# Altium footprint library EnerfiLib.PcbLib: 26 footprints (part 1 of 2)
Each footprint in its own frame and in the unit in brackets; x right, y up, seen from the top. Pads: shape width x height; smd on the part's side, far side on the other; paste and mask are expansions set on the pad; w line width, h text height; cw(c..) or ccw(c..) is an arc to the next point about the centre after c.
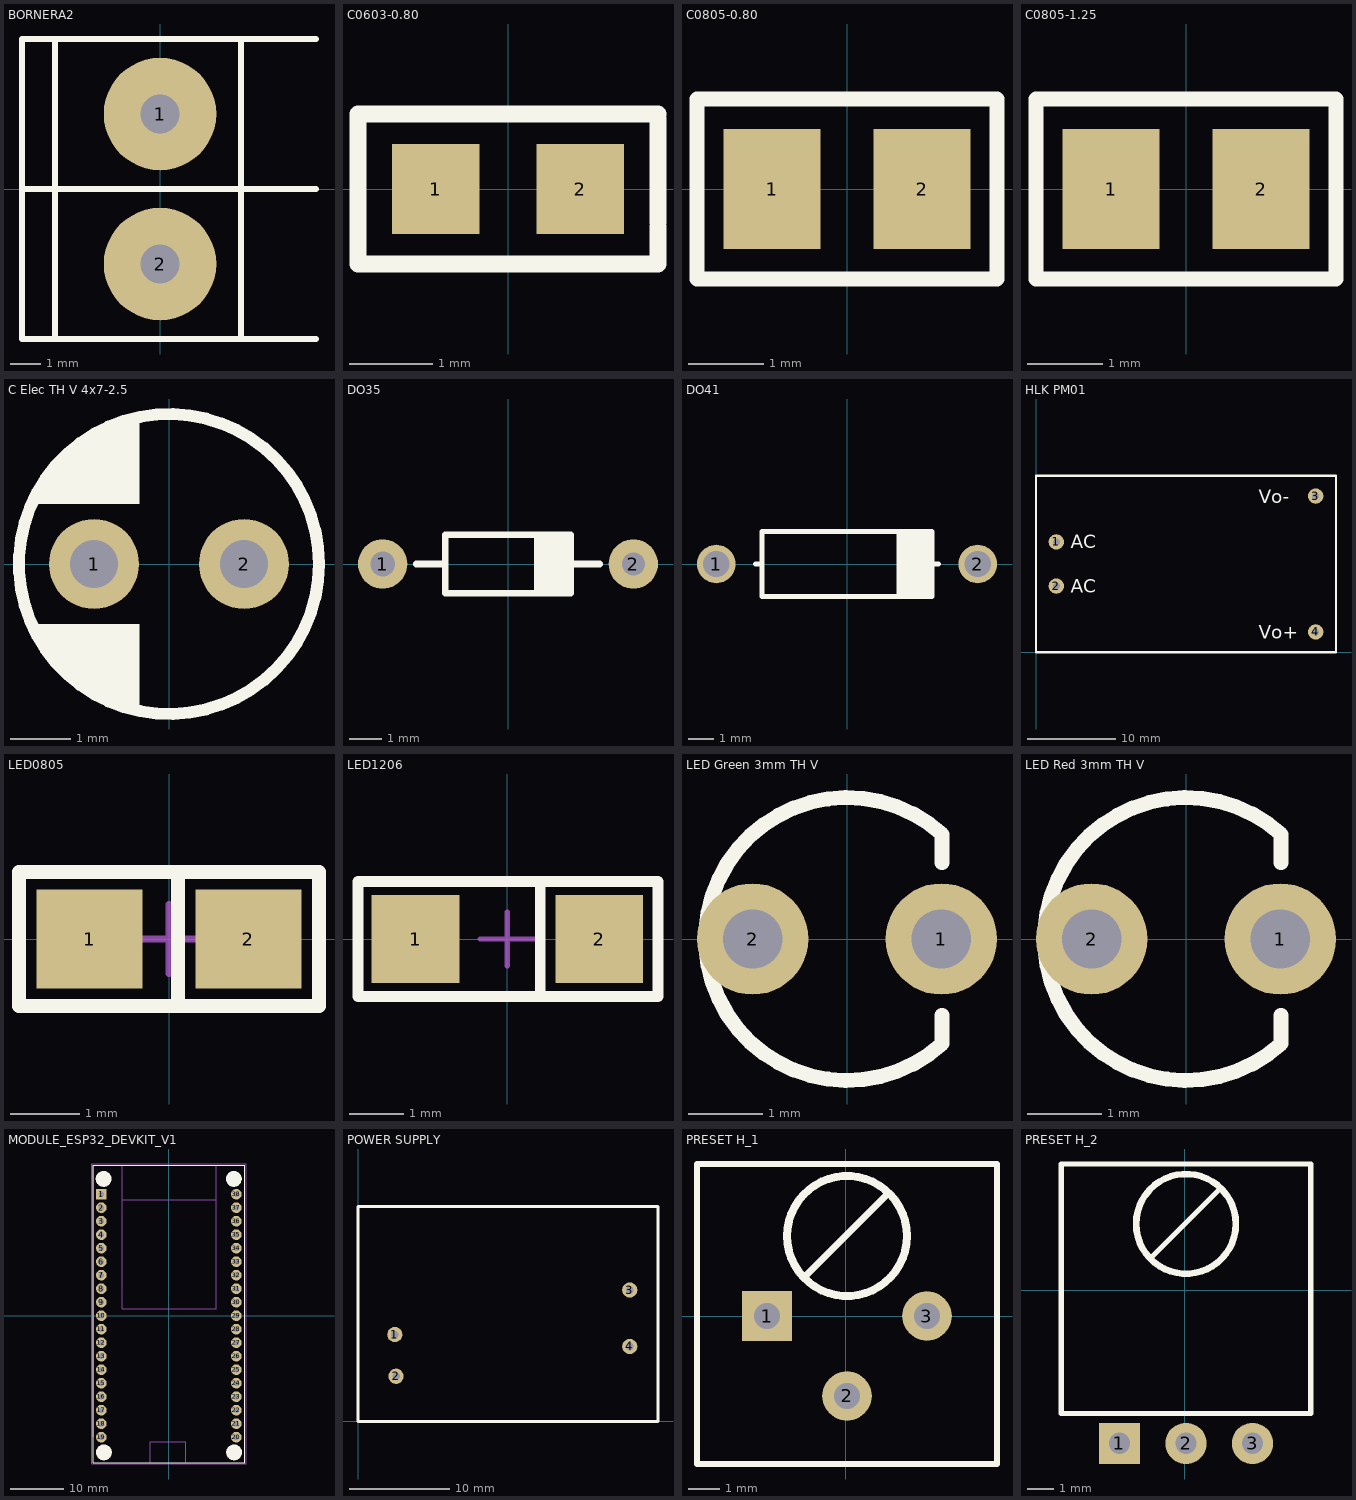
[diagram p0: the footprints below, top view; thin cyan lines are the x and y axes]

## BORNERA2 [mm] "Bornera con Tornillos 5mm separación"
pads (2):
  round 3.75 hole 1.3: 1(0,2.5) 2(0,-2.5)
Top Overlay:
  lines w0.2: -4.6,0 5.2,0 ; -3.5,-5 -3.5,5 ; 2.7,-5 2.7,5 ; 5.2,-5 -4.6,-5 -4.6,5 5.2,5
3D body "BORNERA_2.step": height 10, standoff -2.28, extent -3.763,-4.892 3.937,5.607

## C0603-0.80 [mm] "Capacitor Chip 0603 Height 0.80mm"
height 0.8
pads (2):
  rect 1.05x1.08 smd: 1(-0.865,0) 2(0.865,0)
Top Overlay:
  lines w0.2: 1.8,-0.45 1.8,-0.9 -1.8,-0.9 -1.8,0.9 1.8,0.9 ; 1.8,-0.4 1.8,0.5 ; 1.8,0.4 1.8,0.85
3D body "C0603-0.80.step": height 0.81, standoff 0, extent -0.8,-0.41 0.8,0.41

## C0805-0.80 [mm] "Capacitor Chip 0805 Height 0.80"
height 0.8
pads (2):
  rect 1.3x1.6 smd: 1(-1,0) 2(1,0)
Top Overlay:
  lines w0.2: -2,-0.7 -2,1.2 2,1.2 2,-1.2 -2,-1.2 -2,-0.65
3D body "C0805-0.80.step": height 0.81, standoff 0, extent -0.9,-0.635 0.9,0.635

## C0805-1.25 [mm] "Capacitor Chip 0805 Height 1.25mm"
height 1.25
pads (2):
  rect 1.3x1.6 smd: 1(-1,0) 2(1,0)
Top Overlay:
  lines w0.2: -2,-0.7 -2,1.2 2,1.2 2,-1.2 -2,-1.2 -2,-0.65
3D body "C0805-1.25.step": height 1.26, standoff -0.01, extent -0.9,-0.635 0.9,0.635

## C Elec TH V 4x7-2.5 [mm] "C Elec TH 4x7 2.5mm pitch"
height 8
pads (2):
  round 1.5 hole 0.8: 1(-1.25,0) 2(1.25,0)
Top Overlay:
  circle w0.2: c0,0 r2.5
  region: -0.5,2.4 -0.5,1 -2.3,1 -2.1,1.4 -1.7,1.8 -1.5,2 -1.4,2.1 -1.2,2.2 -0.7,2.4
  region: -0.5,-1 -2.2,-1 -2.2,-1.1 -2,-1.5 -1.9,-1.6 -1.6,-1.9 -1.3,-2.1 -0.7,-2.4 -0.5,-2.4
3D body "C Electro TH 4x7 Generic.STEP": height 7.05, standoff -2.55, extent -1.986,-1.981 2,1.982

## DO35 [mm]
pads (2):
  round 1.5 hole 0.75: 1(-3.81,0)
  round 1.5 hole 0.7: 2(3.81,0)
Top Overlay:
  rectangle: 0.889,-0.889 1.905,0.889
  lines w0.2: -2.794,0 -1.905,0 ; 0.889,-0.762 0.889,0.762 ; 2.032,0 2.794,0 ; -1.905,-0.889 -1.905,0.889 1.905,0.889 1.905,-0.889 -1.905,-0.889
3D body "User Library-DO-35G-30.STEP": height 1.82, standoff -2, extent -4.085,-0.901 4.085,0.901

## DO41 [mm]
pads (2):
  round 1.5 hole 1.016: 1(-5.08,0) 2(5.08,0)
Top Overlay:
  rectangle: 2.032,-1.27 3.302,1.27
  lines w0.2: -3.556,0 -3.302,0 ; 2.032,-1.27 2.032,1.27 ; 3.302,0 3.556,0 ; -3.302,-1.27 -3.302,1.27 3.302,1.27 3.302,-1.27 -3.302,-1.27
3D body "DO41.step": height 2.03, standoff -3.06, extent -5.461,-1.194 5.461,1.372

## HLK PM01 [mm] "HLK PM01 220v to 5v AC-DC Isolated Switching Power Supply"
pads (4):
  round 1.75 hole 0.8: 1(2.3,12.5) 2(2.3,7.5) 3(31.7,17.7) 4(31.7,2.3)
Top Overlay:
  lines w0.254: 0,0 0,20 34,20 34,0 0,0
  text "Vo+" at 25.273,1.524 h1.52
  text "Vo-" at 25.273,16.891 h1.52
  text "AC" at 3.937,6.731 h1.52
  text "AC" at 3.937,11.811 h1.52
3D body "User Library-HLK-PM01.STEP": height 15.6, standoff -4.5, extent -0.127,-0.127 33.873,20.073

## LED0805 [mil] "LED SMD 0805"
height 27.56
pads (2):
  rect 60x56 smd: 1(-45,0) 2(45,0)
Top Overlay:
  lines w7.87: 5,-38 5,38 ; -85,-38 -85,38 85,38 85,-38 -85,-38
Mechanical 15:
  lines w3.94: -19.69,0 19.68,0 ; 0,-19.68 0,19.68
3D body "LED0805.step": height 33.45, standoff 0.23, extent -40.6,-17.68 40.6,18

## LED1206 [mil]
height 27.56
pads (2):
  rect 64x64 smd: 1(-67,0) 2(67,0)
Top Overlay:
  lines w7.87: 24,-42 24,42 ; -109,-42 -109,42 110,42 110,-42 -109,-42
Mechanical 15:
  lines w3.94: -19.68,0 19.69,0 ; 0,-19.68 0,19.69
3D body "LED1206R.STEP": height 43.81, standoff -15.9, extent -61,-31 65,32

## LED Green 3mm TH V [mm] "LED Green 3mm TH V"
height 7.5
pads (2):
  round 1.5 hole 0.8: 1(1.27,0) 2(-1.27,0)
Top Overlay:
  lines w0.2: 1.281,-1.027 1.281,-1.41 cw(c0,0) 1.281,1.41 1.281,1.027
3D body "LED 3mm TH Green.STEP": height 6.6, standoff -3.1, extent -1.6,-1.6 1.5,1.6

## LED Red 3mm TH V [mm] "LED Red 3mm TH V"
height 7.5
pads (2):
  round 1.5 hole 0.8: 1(1.27,0) 2(-1.27,0)
Top Overlay:
  lines w0.2: 1.281,-1.027 1.281,-1.41 cw(c0,0) 1.281,1.41 1.281,1.027
3D body "LED 3mm TH Red.STEP": height 6.6, standoff -3.1, extent -1.6,-1.6 1.5,1.6

## MODULE_ESP32_DEVKIT_V1 [mm]
pads (42):
  rect 2x2 hole 1.02: 1(-12.7,22.86)
  round 2 hole 1.02: 2(-12.7,20.32) 3(-12.7,17.78) 4(-12.7,15.24) 5(-12.7,12.7) 6(-12.7,10.16) 7(-12.7,7.62) 8(-12.7,5.08) 9(-12.7,2.54) 10(-12.7,0) 11(-12.7,-2.54) 12(-12.7,-5.08) 13(-12.7,-7.62) 14(-12.7,-10.16) 15(-12.7,-12.7) 16(-12.7,-15.24) 17(-12.7,-17.78) 18(-12.7,-20.32) 19(-12.7,-22.86) 20(12.7,-22.86) 21(12.7,-20.32) 22(12.7,-17.78) 23(12.7,-15.24) 24(12.7,-12.7) 25(12.7,-10.16) 26(12.7,-7.62) 27(12.7,-5.08) 28(12.7,-2.54) 29(12.7,0) 30(12.7,2.54) 31(12.7,5.08) 32(12.7,7.62) 33(12.7,10.16) 34(12.7,12.7) 35(12.7,15.24) 36(12.7,17.78) 37(12.7,20.32) 38(12.7,22.86)
  round 3 on Top Overlay: ""(-12.28,25.74) ""(-12.23,-25.74) ""(12.23,25.74) ""(12.28,-25.74)
Top Overlay:
  lines w0.127: -14.23,-22.66 -14.23,28.29 ; 14.28,-22.66 14.28,28.29 ; -14.23,28.29 -8.78,28.29 8.91,28.29 14.28,28.29 ; -14.23,28.29 14.28,28.29 ; -14.23,28.29 -14.23,-27.665 14.28,-27.665 14.28,28.29
Mechanical 13:
  lines w0.127: -14.23,-22.66 -14.23,28.29 -8.78,28.29 ; -8.78,28.277 8.91,28.277 ; -3.5,-27.613 -3.5,-23.723 3.211,-23.723 3.211,-27.613 ; 14.28,-22.66 14.28,28.29 8.91,28.29 ; -8.78,21.8 8.91,21.8 ; -8.78,21.8 -8.78,28.29 ; -8.78,21.8 -8.78,1.291 8.91,1.291 8.91,21.8 ; -8.78,28.29 8.91,28.29 ; 8.91,21.8 8.91,28.29
Mechanical 15:
  lines w0.05: -14.48,-27.919 14.53,-27.919 14.53,28.54 -14.48,28.54 -14.48,-27.919
3D body "User Library-Goouuu-ESP32 Development Board.STEP": height 7.14, standoff -6, extent -13.97,-28.13 13.97,27.45

## POWER SUPPLY [mil]
pads (4):
  round 60 hole 30: 1(145,342.13) 2(150,177.95) 3(1070,517.72) 4(1070,295.28)
Top Overlay:
  lines w10: 0,0 0,846.46 1181.1,846.46 1181.1,0 0,0

## PRESET H_1 [mil]
pads (3):
  rect 62x62 hole 32: 1(-98.42,0)
  round 62 hole 32: 2(1.57,-100) 3(101.57,0)
Top Overlay:
  circle w10: c1.57,100 r75
  lines w7.87: -49.7,50.59 50.3,150.59 ; -185.93,-185 189.07,-185 189.07,190 -185.93,190 -185.93,-185
3D body "PRESET HORIZONTAL.step": height 196.85, standoff -190.16, extent -190,-187.6 185.2,187.6

## PRESET H_2 [mil]
pads (3):
  rect 62x62 hole 32: 1(-98.43,-230)
  round 62 hole 32: 2(1.57,-230) 3(101.57,-230)
Top Overlay:
  circle w10: c1.57,100 r75
  lines w7.87: -49.7,50.59 50.3,150.59 ; -185.93,-185 -185.93,190 189.07,190 189.07,-185 -185.93,-185
3D body "PRESET HORIZONTAL.step": height 196.85, standoff -190.16, extent -190,-187.6 185.2,187.6